# Altium footprint library NFC-Reader.PcbLib: 67 footprints (part 2 of 5)
Each footprint in its own frame and in the unit in brackets; x right, y up, seen from the top. Pads: shape width x height; smd on the part's side, far side on the other; paste and mask are expansions set on the pad; w line width, h text height; cw(c..) or ccw(c..) is an arc to the next point about the centre after c.
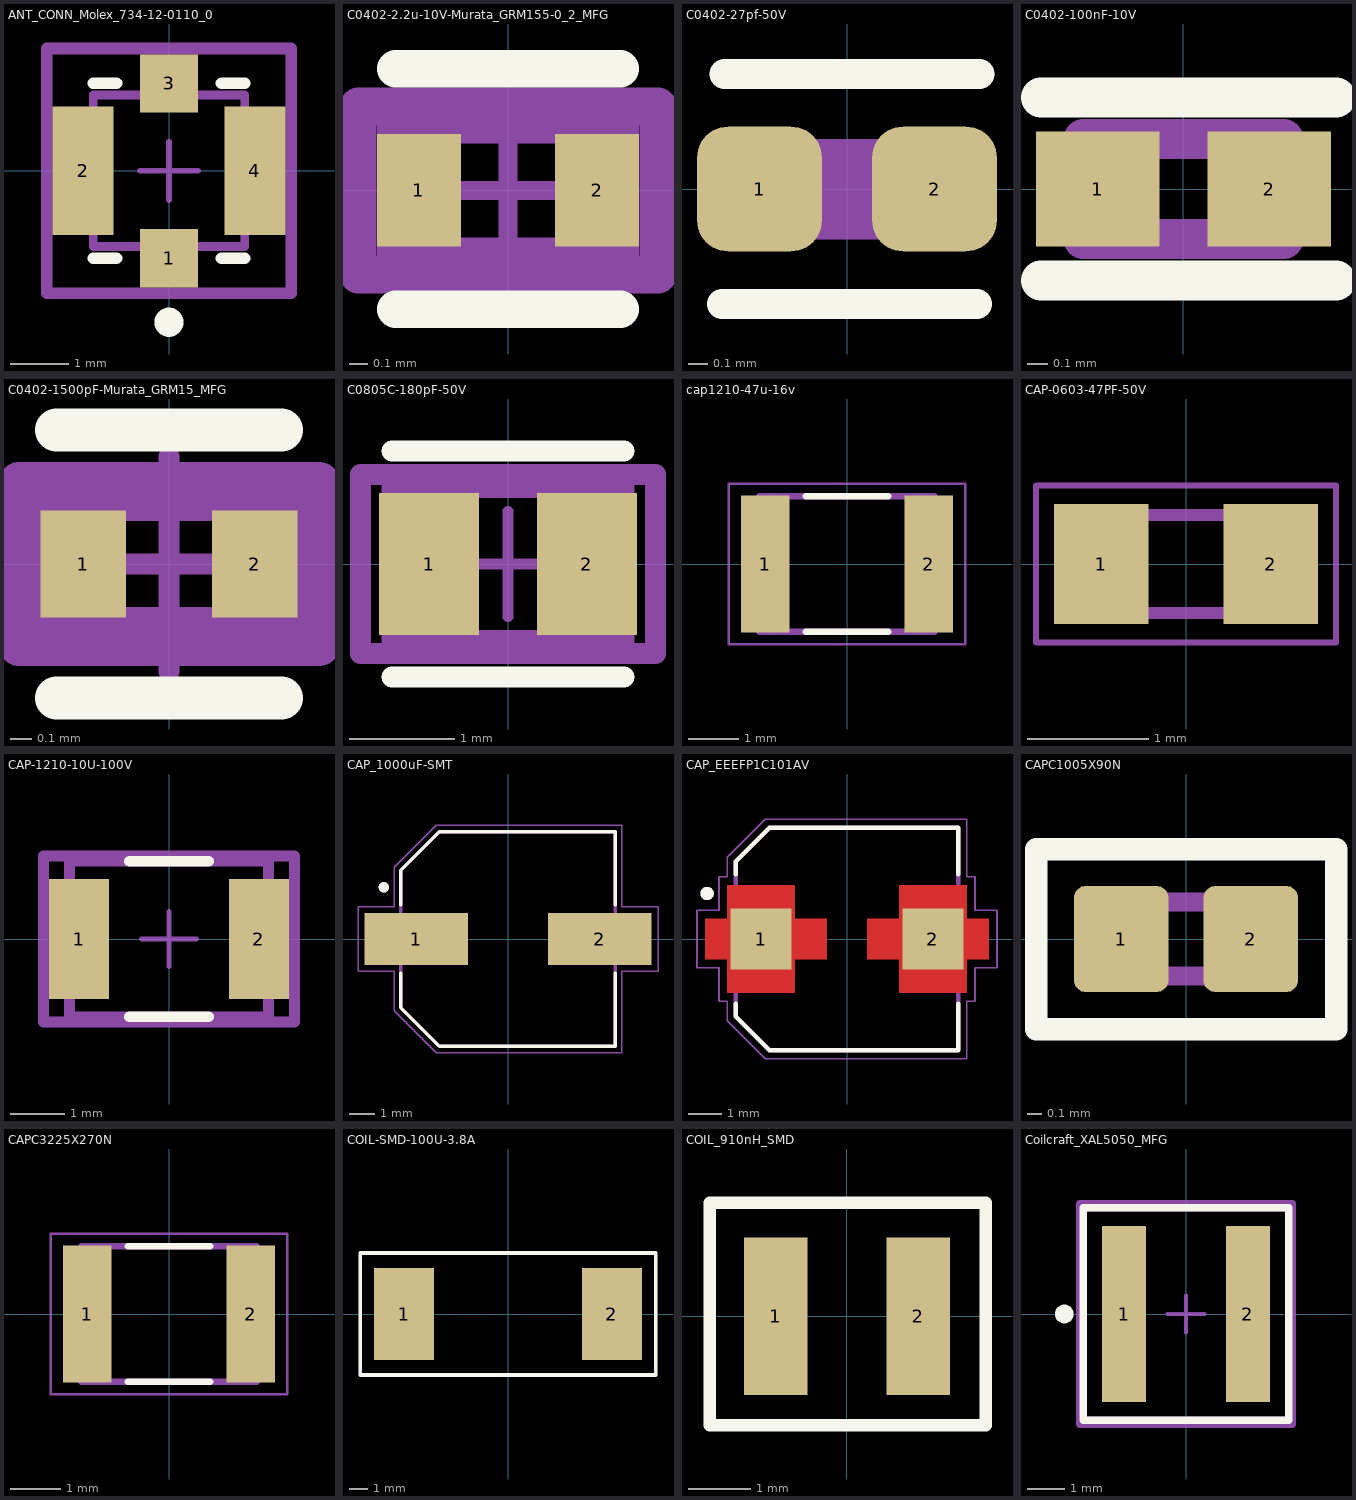
[diagram p1: the footprints below, top view; thin cyan lines are the x and y axes]

## ANT_CONN_Molex_734-12-0110_0 [mm]
pads (4):
  rect 1x1 smd paste+0 mask+0: 1(0,-1.5) 3(0,1.5)
  rect 1.05x2.2 smd paste+0 mask+0: 2(-1.475,0) 4(1.475,0)
Top Overlay:
  circle w0.25: c0,-2.6 r0.125
  lines w0.2: -1.3,-1.5 -0.9,-1.5 ; -1.3,1.5 -0.9,1.5 ; 0.9,-1.5 1.3,-1.5 ; 0.9,1.5 1.3,1.5
Mechanical 10:
  lines w0.2: -2.1,-2.1 2.1,-2.1 2.1,2.1 -2.1,2.1 -2.1,-2.1
  text ".Designator" at 0,0 h1
Mechanical 12:
  lines w0.15: -1.3,-1.3 1.3,-1.3 1.3,1.3 -1.3,1.3 -1.3,-1.3
Top Courtyard:
  lines w0.1: -0.5,0 0.5,0 ; 0,-0.5 0,0.5
  lines w0.2: -2.1,-2.1 2.1,-2.1 2.1,2.1 -2.1,2.1 -2.1,-2.1
3D body "U.FL-R-SMT-1_10_.step": height 1.25, standoff 0, extent -1.5,-1.677 1.5,1.423

## C0402-2.2u-10V-Murata_GRM155-0_2_MFG [mm]
pads (2):
  rect 0.45x0.6 smd paste+0 mask+0: 1(-0.475,0) 2(0.475,0)
Top Overlay:
  lines w0.2: -0.6,-0.635 0.6,-0.635 ; -0.6,0.65 0.6,0.65
Mechanical 10:
  lines w0.2: -0.8,-0.45 -0.8,0.45 0.8,0.45 0.8,-0.45 -0.8,-0.45
  text ".Designator" at 0,0.188 h1
Mechanical 12:
  lines w0.2: -0.6,-0.35 -0.6,0.35 0.6,0.35 0.6,-0.35 -0.6,-0.35
Top Courtyard:
  lines w0.1: -0.5,0 0.5,0 ; 0,-0.5 0,0.5
  lines w0.2: -0.8,-0.45 -0.8,0.45 0.8,0.45 0.8,-0.45 -0.8,-0.45
3D body "Cap_Murata_GRM155Z71A225KE44D_eec.STEP": height 0.25, standoff 0, extent -0.8,-0.45 0.8,0.45

## C0402-27pf-50V [mil]
pads (2):
  rrect50% 25x25 smd: 1(-17.5,0) 2(17.5,0)
Top Overlay:
  lines w5.91: -25,-23 26,-23 ; -24.5,23 26.5,23
Top 3D Body:
  region: 20,10 20,-10 -20,-10 -20,10
3D body "step_temp.STEP": height 21.65, standoff 0, extent -20,-9.84 19.37,9.84

## C0402-100nF-10V [mm]
pads (2):
  rect 0.615x0.572 smd paste+0 mask+0: 1(-0.429,0) 2(0.429,0)
Top Overlay:
  lines w0.2: -0.711,-0.457 0.761,-0.457 ; -0.711,0.457 0.761,0.457
Mechanical 10:
  text ".Designator" at 0,-0.001 h1
Mechanical 12:
  lines w0.2: -0.5,-0.25 -0.5,0.25 0.5,0.25 0.5,-0.25 -0.5,-0.25
3D body "Cap_Samsung_CL05B104KP5NNNC_eec.STEP": height 0.25, standoff 0, extent -0.886,-0.436 0.886,0.436

## C0402-1500pF-Murata_GRM15_MFG [mm]
pads (2):
  rect 0.4x0.5 smd paste+0 mask+0: 1(-0.4,0) 2(0.4,0)
Top Overlay:
  lines w0.2: -0.525,-0.625 0.525,-0.625 ; -0.525,0.625 0.525,0.625
Mechanical 10:
  lines w0.2: -0.7,-0.375 -0.7,0.375 0.7,0.375 0.7,-0.375 -0.7,-0.375
  text ".Designator" at 0,0 h1
Mechanical 12:
  lines w0.15: -0.525,-0.275 -0.525,0.275 0.525,0.275 0.525,-0.275 -0.525,-0.275
Top Courtyard:
  lines w0.1: -0.5,0 0.5,0 ; 0,-0.5 0,0.5
  lines w0.2: -0.7,-0.375 -0.7,0.375 0.7,0.375 0.7,-0.375 -0.7,-0.375
3D body "Cap_Murata_GCM1555C1H271JA16D_eec.STEP": height 0.25, standoff 0, extent -0.7,-0.375 0.7,0.375

## C0805C-180pF-50V [mm]
pads (2):
  rect 0.95x1.35 smd paste+0 mask+0: 1(-0.75,0) 2(0.75,0)
Top Overlay:
  lines w0.2: -1.1,-1.075 1.1,-1.075 ; -1.1,1.075 1.1,1.075
Mechanical 10:
  lines w0.2: -1.4,-0.85 1.4,-0.85 1.4,0.85 -1.4,0.85 -1.4,-0.85
  text ".Designator" at 0,0.188 h1
Mechanical 12:
  lines w0.2: -1.1,-0.725 1.1,-0.725 1.1,0.725 -1.1,0.725 -1.1,-0.725
Top Courtyard:
  lines w0.1: -0.5,0 0.5,0 ; 0,-0.5 0,0.5
  lines w0.2: -1.4,-0.85 1.4,-0.85 1.4,0.85 -1.4,0.85 -1.4,-0.85
3D body "Cap_KEMET_C0805C181K5GACTU_eec.STEP": height 0.25, standoff 0, extent -1.4,-0.85 1.4,0.85

## cap1210-47u-16v [mm]
pads (2):
  rect 0.96x2.72 smd: 1(-1.625,0) 2(1.625,0)
Top Overlay:
  lines w0.127: -0.82,-1.35 0.82,-1.35 ; -0.82,1.35 0.82,1.35
Top 3D Body:
  lines w0.127: -1.75,-1.35 1.75,-1.35 1.75,1.35 -1.75,1.35 -1.75,-1.35
Top Courtyard:
  lines w0.05: -2.355,-1.6 2.355,-1.6 2.355,1.6 -2.355,1.6 -2.355,-1.6
3D body "step_temp.STEP": height 2.7, standoff 0, extent -1.6,-1.25 1.6,1.25

## CAP-0603-47PF-50V [mm]
pads (2):
  rect 0.78x0.99 smd: 1(-0.7,0) 2(0.7,0)
Top Courtyard:
  lines w0.1: -0.8,-0.405 0.8,-0.405 0.8,0.405 -0.8,0.405 -0.8,-0.405
Bottom Assembly:
  lines w0.05: -1.24,-0.65 1.24,-0.65 1.24,0.65 -1.24,0.65 -1.24,-0.65
3D body "Cap_Taiyo_Yuden_LMK107SD223KA-T_eec.STEP": height 0.25, standoff 0, extent -1.023,-0.55 1.277,0.55

## CAP-1210-10U-100V [mm]
pads (2):
  rect 1.1x2.2 smd paste+0 mask+0: 1(-1.65,0) 2(1.65,0)
Top Overlay:
  lines w0.2: -0.725,-1.425 0.725,-1.425 ; -0.725,1.425 0.725,1.425
Mechanical 10:
  lines w0.2: -2.3,-1.525 2.3,-1.525 2.3,1.525 -2.3,1.525 -2.3,-1.525
  text ".Designator" at 0,0.188 h1
Mechanical 12:
  lines w0.2: -1.825,-1.425 1.825,-1.425 1.825,1.425 -1.825,1.425 -1.825,-1.425
Top Courtyard:
  lines w0.1: -0.5,0 0.5,0 ; 0,-0.5 0,0.5
  lines w0.2: -2.3,-1.525 2.3,-1.525 2.3,1.525 -2.3,1.525 -2.3,-1.525
3D body "Cap_TDK_C3225X7R2A106K250AC_eec.STEP": height 0.25, standoff 0, extent -2.3,-1.525 2.3,1.525

## CAP_1000uF-SMT [mm]
height 10.2
pads (2):
  rect 4x2 smd: 1(-3.55,0) 2(3.55,0)
Top Overlay:
  circle w0.2: c-4.8,2 r0.1
  lines w0.127: -4.15,-1.32 -4.15,-2.65 -2.65,-4.15 4.15,-4.15 4.15,-1.32 ; -4.15,1.32 -4.15,2.65 -2.65,4.15 4.15,4.15 4.15,1.32
Top 3D Body:
  circle w0.2: c-4.8,2 r0.1
  lines w0.127: -4.15,-2.65 -2.65,-4.15 4.15,-4.15 4.15,4.15 -2.65,4.15 -4.15,2.65 -4.15,-2.65
Top Courtyard:
  lines w0.05: -5.8,-1.25 -5.8,1.25 -4.4,1.25 -4.4,2.775 -2.775,4.4 4.4,4.4 4.4,1.25 5.8,1.25 5.8,-1.25 4.4,-1.25 4.4,-4.4 -2.775,-4.4 -4.4,-2.775 -4.4,-1.25 -5.8,-1.25
3D body "step_temp.STEP": height 10.2, standoff 0, extent -4.85,-4.15 4.85,4.15

## CAP_EEEFP1C101AV [mm]
pads (2):
  rect 1.8x1.8 smd paste-2 mask+0: 1(-2.55,0) 2(2.55,0)
Top Layer:
  region: -1.55,0.6 -0.6,0.6 -0.6,-0.6 -1.55,-0.6 -1.55,-1.6 -3.55,-1.6 -3.55,-0.6 -4.2,-0.6 -4.2,0.6 -3.55,0.6 -3.55,1.6 -1.55,1.6
  region: 3.55,0.6 4.2,0.6 4.2,-0.6 3.55,-0.6 3.55,-1.6 1.55,-1.6 1.55,-0.6 0.6,-0.6 0.6,0.6 1.55,0.6 1.55,1.6 3.55,1.6
Top Overlay:
  circle w0.2: c-4.15,1.35 r0.1
  lines w0.127: -3.3,-1.92 -3.3,-2.3 -2.3,-3.3 3.3,-3.3 3.3,-1.92 ; -3.3,1.92 -3.3,2.3 -2.3,3.3 3.3,3.3 3.3,1.92
Top Paste:
  region: -1.55,0.6 -0.6,0.6 -0.6,-0.6 -1.55,-0.6 -1.55,-1.6 -3.55,-1.6 -3.55,-0.6 -4.2,-0.6 -4.2,0.6 -3.55,0.6 -3.55,1.6 -1.55,1.6
  region: 3.55,0.6 4.2,0.6 4.2,-0.6 3.55,-0.6 3.55,-1.6 1.55,-1.6 1.55,-0.6 0.6,-0.6 0.6,0.6 1.55,0.6 1.55,1.6 3.55,1.6
Top Solder:
  region: -1.45,0.7 -0.5,0.7 -0.5,-0.7 -1.45,-0.7 -1.45,-1.7 -3.65,-1.7 -3.65,-0.7 -4.3,-0.7 -4.3,0.7 -3.65,0.7 -3.65,1.7 -1.45,1.7
  region: 3.65,0.7 4.3,0.7 4.3,-0.7 3.65,-0.7 3.65,-1.7 1.45,-1.7 1.45,-0.7 0.5,-0.7 0.5,0.7 1.45,0.7 1.45,1.7 3.65,1.7
Top 3D Body:
  circle w0.2: c-4.15,1.35 r0.1
  lines w0.127: -3.3,-2.3 -3.3,2.3 -2.3,3.3 3.3,3.3 3.3,-3.3 -2.3,-3.3 -3.3,-2.3
Top Courtyard:
  lines w0.05: -4.45,-0.85 -3.8,-0.85 -3.8,-1.85 -3.55,-1.85 -3.55,-2.425 -2.425,-3.55 3.55,-3.55 3.55,-1.85 3.8,-1.85 3.8,-0.85 4.45,-0.85 4.45,0.85 3.8,0.85 3.8,1.85 3.55,1.85 3.55,3.55 -2.425,3.55 -3.55,2.425 -3.55,1.85 -3.8,1.85 -3.8,0.85 -4.45,0.85 -4.45,-0.85
3D body "step_temp.STEP": height 6.1, standoff 0, extent -3.65,-3.3 3.65,3.3

## CAPC1005X90N [mm]
pads (2):
  rrect25% 0.64x0.72 smd: 1(-0.439,0) 2(0.439,0)
Top Overlay:
  lines w0.152: -1.016,-0.61 -1.016,0.61 1.016,0.61 1.016,-0.61 -1.016,-0.61
Top 3D Body:
  lines w0.127: -0.5,-0.25 0.5,-0.25 0.5,0.25 -0.5,0.25 -0.5,-0.25
Top Courtyard:
  lines w0.05: -1.009,-0.61 1.009,-0.61 1.009,0.61 -1.009,0.61 -1.009,-0.61
3D body "step_temp.STEP": height 0.9, standoff 0, extent -0.5,-0.25 0.5,0.25

## CAPC3225X270N [mm]
pads (2):
  rect 0.96x2.72 smd: 1(-1.625,0) 2(1.625,0)
Top Overlay:
  lines w0.127: -0.82,-1.35 0.82,-1.35 ; -0.82,1.35 0.82,1.35
Top 3D Body:
  lines w0.127: -1.75,-1.35 -1.75,1.35 1.75,1.35 1.75,-1.35 -1.75,-1.35
Top Courtyard:
  lines w0.05: -2.355,-1.6 -2.355,1.6 2.355,1.6 2.355,-1.6 -2.355,-1.6
3D body "step_temp.STEP": height 2.7, standoff 0, extent -1.6,-1.25 1.6,1.25

## COIL-SMD-100U-3.8A [mm]
pads (2):
  rect 3.25x5 smd: 1(-5.625,0) 2(5.625,0)
Top Overlay:
  lines w0.2: -8.001,-3.302 8.001,-3.302 8.001,3.302 -8.001,3.302 -8.001,0.243 -8.001,-3.302
3D body "MSS1583-104KED.stp": height 8.6, standoff 0, extent -7.5,-7.373 7.5,7.627

## COIL_910nH_SMD [mm]
pads (2):
  rect 1.02x2.54 smd: 1(-1.145,0) 2(1.145,0)
Top Overlay:
  lines w0.2: -2.21,-1.753 -2.21,1.829 -2.184,1.829 2.235,1.829 2.235,-1.753 -2.21,-1.753
3D body "WE-KI_1008A+%28rev1%29.stp": height 1.11, standoff -0.02, extent -1.25,-1.016 1.25,0.989

## Coilcraft_XAL5050_MFG [mm]
pads (2):
  rect 1.18x4.7 smd paste+0 mask+0: 1(-1.655,0) 2(1.655,0)
Top Overlay:
  circle w0.25: c-3.25,0 r0.125
  lines w0.2: -2.74,-2.84 2.74,-2.84 2.74,2.84 -2.74,2.84 -2.74,-2.84
Mechanical 10:
  lines w0.2: -2.84,-2.94 2.84,-2.94 2.84,2.94 -2.84,2.94 -2.84,-2.94
  text ".Designator" at 0,0.188 h1
Mechanical 12:
  lines w0.2: -2.74,-2.84 2.74,-2.84 2.74,2.84 -2.74,2.84 -2.74,-2.84
Top Courtyard:
  lines w0.1: -0.5,0 0.5,0 ; 0,-0.5 0,0.5
  lines w0.2: -2.84,-2.94 2.84,-2.94 2.84,2.94 -2.84,2.94 -2.84,-2.94
3D body "Ind_Coilcraft_XAL5050-822MEC_eec.STEP": height 0.25, standoff 0, extent -2.84,-2.94 2.84,2.94